# Altium footprint library ICPOWER.PcbLib: 71 footprints (part 2 of 5)
Each footprint in its own frame and in the unit in brackets; x right, y up, seen from the top. Pads: shape width x height; smd on the part's side, far side on the other; paste and mask are expansions set on the pad; w line width, h text height; cw(c..) or ccw(c..) is an arc to the next point about the centre after c.
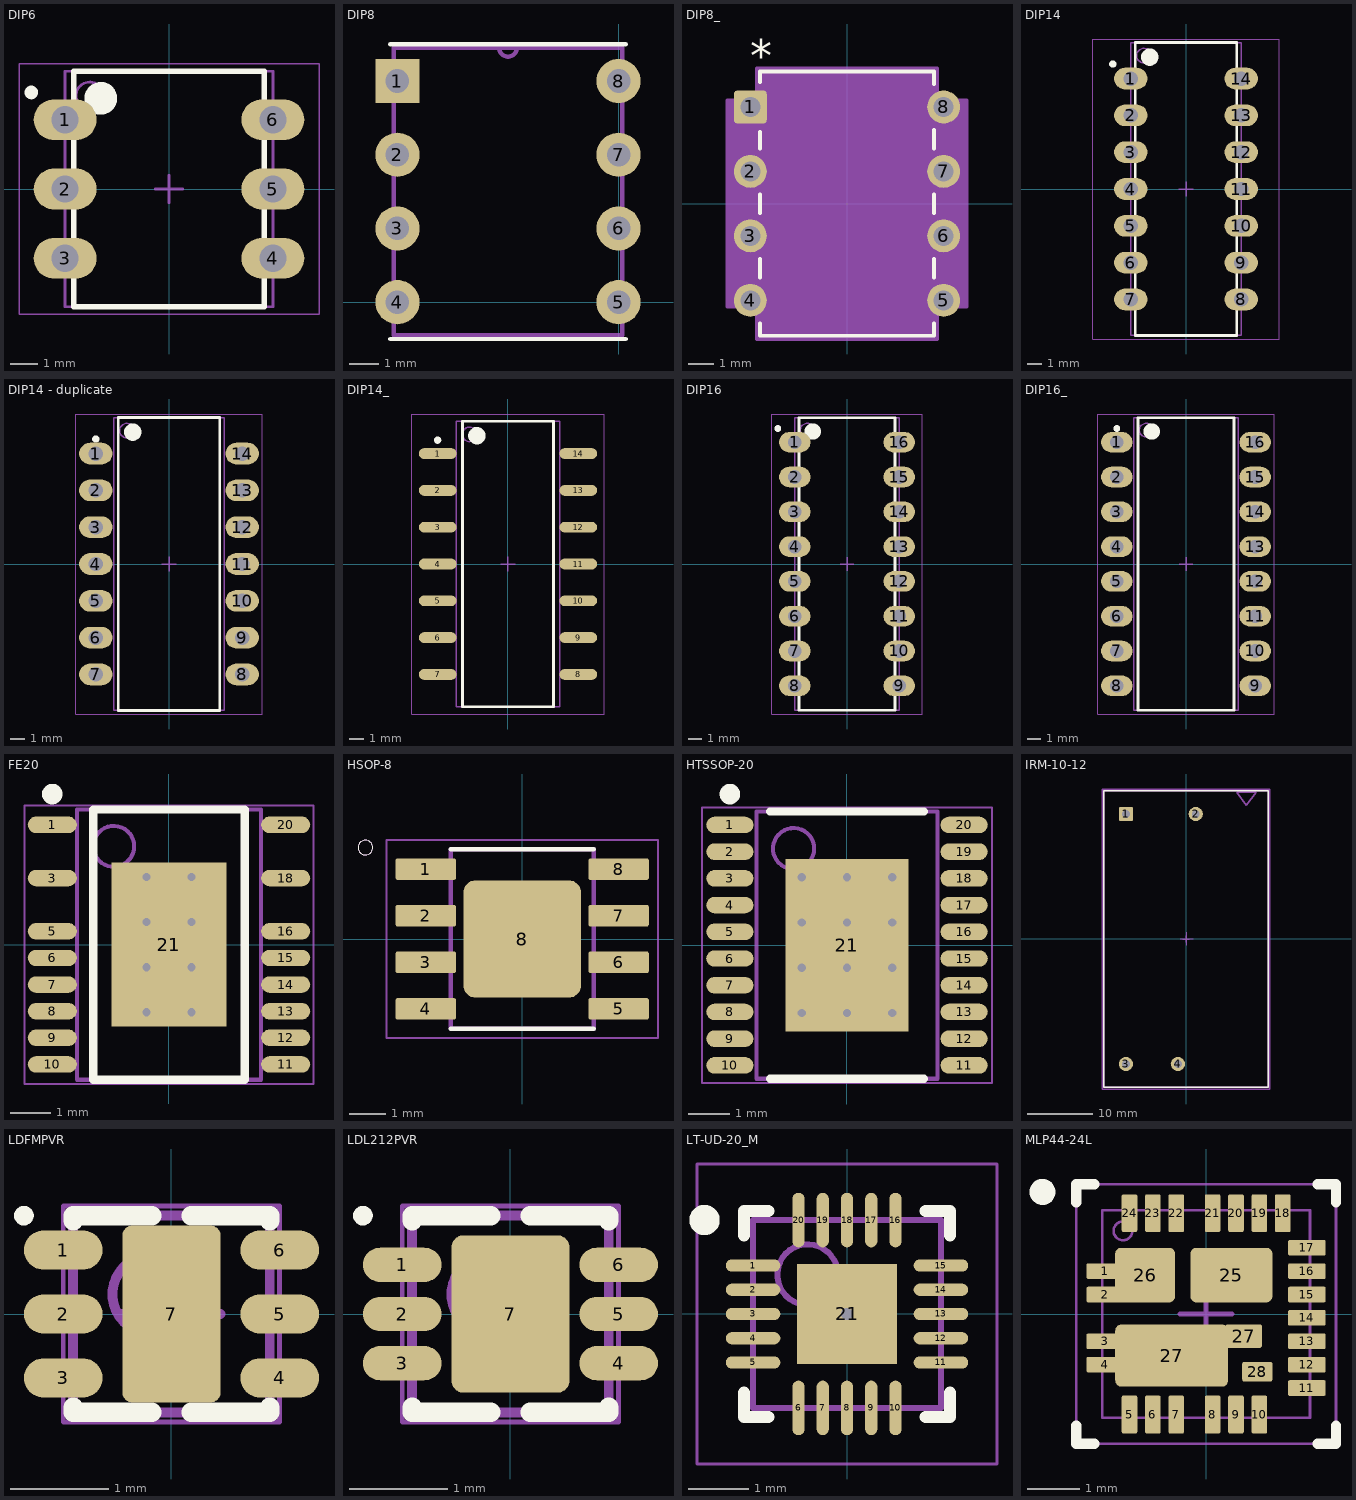
[diagram p1: the footprints below, top view; thin cyan lines are the x and y axes]

## DIP6 [mm] "UC3823N, IPC Medium Density"
height 5.08
pads (6):
  oval 2.3x1.5 hole 1: 1(-3.81,2.54) 2(-3.81,0) 3(-3.81,-2.54) 4(3.81,-2.54) 5(3.81,0) 6(3.81,2.54)
Top Overlay:
  circle w0.25: c-5.05,3.54 r0.125
  circle w0.6: c-2.5,3.325 r0.3
  lines w0.2: -3.5,-4.325 -3.5,4.325 3.5,4.325 3.5,-4.325 -3.5,-4.325
Mechanical 13:
  circle w0.1: c-2.91,3.42 r0.5
  lines w0.1: -3.81,-4.32 3.81,-4.32 3.81,4.32 -3.81,4.32 -3.81,-4.3
Mechanical 15:
  lines w0.05: -5.5,-4.6 -5.5,4.6 5.5,4.6 5.5,-4.6 -5.5,-4.6
  lines w0.1: -0.5,0 0.5,0 ; 0,-0.5 0,0.5
3D body "DIP6.STEP": height 4.8, standoff -2.5, extent -3.925,-3.56 3.945,3.56

## DIP8 [mil]
pads (8):
  rect 60x60 hole 32: 1(-300,300)
  round 60 hole 32: 2(-300,200) 3(-300,100) 4(-300,0) 5(0,0) 6(0,100) 7(0,200) 8(0,300)
Top Overlay:
  lines w6: -310,-50 10,-50 ; -310,350 10,350
M1_3D_TOP:
  lines w6: -162,345 ccw(c-150,345) -138,345 ; -162,345 -305,345 -305,-45 5,-45 5,345 -138,345 ; -162,345 -138,345 ; -316,-16 -305,-16 -305,16 -316,16 -316,-16 ; -316,84 -305,84 -305,116 -316,116 -316,84 ; -316,184 -305,184 -305,216 -316,216 -316,184 ; -316,284 -305,284 -305,316 -316,316 -316,284 ; 5,-16 16,-16 16,16 5,16 5,-16 ; 5,84 16,84 16,116 5,116 5,84 ; 5,184 16,184 16,216 5,216 5,184 ; 5,284 16,284 16,316 5,316 5,284
3D body "DIP8.step": height 165, standoff -105, extent -304.61,-74.8 5.39,375.2

## DIP8_ [mil]
pads (8):
  rrect20% 51x51 hole 31 paste+0 mask+0: 1(-150,150)
  round 51 hole 31 paste+0 mask+0: 2(-150,50) 3(-150,-50) 4(-150,-150) 5(150,-150) 6(150,-50) 7(150,50) 8(150,150)
Top Overlay:
  lines w6: -135,-185.57 -135,-205 135,-205 135,-185.57 ; -135,-114.43 -135,-85.57 ; -135,-14.43 -135,14.43 ; -135,85.57 -135,111.4 ; -135,188.6 -135,205 135,205 135,185.57 ; 135,-114.43 135,-85.57 ; 135,-14.43 135,14.43 ; 135,85.57 135,114.43
  text "*" at -150,205.5 h50
Mechanical 13:
  lines w0: -12,200 ccw(c0,200) 12,200
  lines w1: -165.5,-165.5 -165.5,-134.5 -130,-134.5 -130,-165.5 -165.5,-165.5 ; -165.5,-65.5 -165.5,-34.5 -130,-34.5 -130,-65.5 -165.5,-65.5 ; -165.5,34.5 -165.5,65.5 -130,65.5 -130,34.5 -165.5,34.5 ; -165.5,134.5 -165.5,165.5 -130,165.5 -130,134.5 -165.5,134.5 ; -130,-200 130,-200 130,200 -130,200 -130,-200 ; 130,-165.5 130,-134.5 165.5,-134.5 165.5,-165.5 130,-165.5 ; 130,-65.5 130,-34.5 165.5,-34.5 165.5,-65.5 130,-65.5 ; 130,34.5 130,65.5 165.5,65.5 165.5,34.5 130,34.5 ; 130,134.5 130,165.5 165.5,165.5 165.5,134.5 130,134.5
  text "RefDes2" at 0,0 h50
  text "*" at -120,150 h50
Mechanical 15:
  region: 140,-160 185.5,-160 185.5,160 140,160 140,210 -140,210 -140,160 -185.5,160 -185.5,-160 -140,-160 -140,-210 140,-210
  lines w6: -185.5,-160 -185.5,160 -140,160 -140,210 140,210 140,160 185.5,160 185.5,-160 140,-160 140,-210 -140,-210 -140,-160 -185.5,-160
3D body: height 10, standoff 0, extent 150,-150 160,-140
3D body "DIP8.step": height 165, standoff -105, extent -154.61,-224.8 155.39,225.2

## DIP14 [mm] "DIP14, IPC Medium Density"
height 5.33
pads (14):
  oval 2.3x1.5 hole 1: 1(-3.81,7.62) 2(-3.81,5.08) 3(-3.81,2.54) 4(-3.81,0) 5(-3.81,-2.54) 6(-3.81,-5.08) 7(-3.81,-7.62) 8(3.81,-7.62) 9(3.81,-5.08) 10(3.81,-2.54) 11(3.81,0) 12(3.81,2.54) 13(3.81,5.08) 14(3.81,7.62)
Top Overlay:
  circle w0.6: c-2.5,9.1 r0.3
  circle w0.25: c-5.05,8.62 r0.125
  lines w0.2: -3.5,-10.1 -3.5,10.1 3.5,10.1 3.5,-10.1 -3.5,-10.1
Mechanical 13:
  circle w0.1: c-2.91,9.2 r0.5
  lines w0.1: -3.81,-10.1 -3.81,10.1 3.81,10.1 3.81,-10.1 -3.81,-10.1
Mechanical 15:
  lines w0.05: -6.45,-10.35 -6.45,10.35 6.45,10.35 6.45,-10.35 -6.45,-10.35
  lines w0.1: -0.5,0 0.5,0 ; 0,-0.5 0,0.5
3D body "DIP-14.step": height 4.01, standoff -2.97, extent -4,-9.525 4,9.525

## DIP14 - duplicate [mm] "DIP14, IPC Medium Density"
height 5.33
pads (14):
  oval 2.3x1.5 hole 1: 1(-5.05,7.62) 2(-5.05,5.08) 3(-5.05,2.54) 4(-5.05,0) 5(-5.05,-2.54) 6(-5.05,-5.08) 7(-5.05,-7.62) 8(5.05,-7.62) 9(5.05,-5.08) 10(5.05,-2.54) 11(5.05,0) 12(5.05,2.54) 13(5.05,5.08) 14(5.05,7.62)
Top Overlay:
  circle w0.25: c-5.05,8.62 r0.125
  circle w0.6: c-2.5,9.1 r0.3
  lines w0.2: -3.5,-10.1 3.5,-10.1 3.5,10.1 -3.5,10.1 -3.5,-10.1
Mechanical 13:
  circle w0.1: c-2.91,9.2 r0.5
  lines w0.1: -3.81,-10.1 3.81,-10.1 3.81,10.1 -3.81,10.1 -3.81,-10.1
Mechanical 15:
  lines w0.05: -6.45,-10.35 6.45,-10.35 6.45,10.35 -6.45,10.35 -6.45,-10.35
  lines w0.1: -0.5,0 0.5,0 ; 0,-0.5 0,0.5
3D body "DIP14.step": height 4.95, standoff 0, extent -5.805,-10.1 5.805,10.1

## DIP14_ [mm] "DIP14_MS-001AA, IPC Low Density"
height 5.33
pads (14):
  oval 2.6x0.75 smd: 1(-4.855,7.62) 2(-4.855,5.08) 3(-4.855,2.54) 4(-4.855,0) 5(-4.855,-2.54) 6(-4.855,-5.08) 7(-4.855,-7.62) 8(4.855,-7.62) 9(4.855,-5.08) 10(4.855,-2.54) 11(4.855,0) 12(4.855,2.54) 13(4.855,5.08) 14(4.855,7.62)
Top Overlay:
  circle w0.6: c-2.15,8.85 r0.3
  circle w0.25: c-4.855,8.545 r0.125
  lines w0.2: -3.15,-9.85 -3.15,9.85 3.15,9.85 3.15,-9.85 -3.15,-9.85
M3_comm_top:
  text ".comment" at -0.9,-0.3 h1
Mechanical 13:
  circle w0.1: c-2.655,8.945 r0.5
  lines w0.1: -3.555,-9.845 -3.555,9.845 3.555,9.845 3.555,-9.845 -3.555,-9.845
Mechanical 15:
  lines w0.05: -6.65,-10.35 -6.65,10.35 6.65,10.35 6.65,-10.35 -6.65,-10.35
  lines w0.1: -0.5,0 0.5,0 ; 0,-0.5 0,0.5
3D body: height 5.33, standoff 0.38, extent -3.555,-9.845 3.555,9.845

## DIP16 [mm] "UC3823N, IPC Medium Density"
height 5.08
pads (16):
  oval 2.3x1.5 hole 1: 1(-3.81,8.89) 2(-3.81,6.35) 3(-3.81,3.81) 4(-3.81,1.27) 5(-3.81,-1.27) 6(-3.81,-3.81) 7(-3.81,-6.35) 8(-3.81,-8.89) 9(3.81,-8.89) 10(3.81,-6.35) 11(3.81,-3.81) 12(3.81,-1.27) 13(3.81,1.27) 14(3.81,3.81) 15(3.81,6.35) 16(3.81,8.89)
Top Overlay:
  circle w0.6: c-2.5,9.675 r0.3
  circle w0.25: c-5.05,9.89 r0.125
  lines w0.2: -3.5,-10.675 -3.5,10.675 3.5,10.675 3.5,-10.675 -3.5,-10.675
Mechanical 13:
  circle w0.1: c-2.91,9.77 r0.5
  lines w0.1: -3.81,-10.67 -3.81,10.67 3.81,10.67 3.81,-10.67 -3.81,-10.67
Mechanical 15:
  lines w0.05: -5.5,-10.95 -5.5,10.95 5.5,10.95 5.5,-10.95 -5.5,-10.95
  lines w0.1: -0.5,0 0.5,0 ; 0,-0.5 0,0.5
3D body "DIP16-22mm.STEP": height 5.15, standoff -2.49, extent -3.925,-10.99 3.945,11.01

## DIP16_ [mm] "UC3823N, IPC Medium Density"
height 5.08
pads (16):
  oval 2.3x1.5 hole 1: 1(-5.05,8.89) 2(-5.05,6.35) 3(-5.05,3.81) 4(-5.05,1.27) 5(-5.05,-1.27) 6(-5.05,-3.81) 7(-5.05,-6.35) 8(-5.05,-8.89) 9(5.05,-8.89) 10(5.05,-6.35) 11(5.05,-3.81) 12(5.05,-1.27) 13(5.05,1.27) 14(5.05,3.81) 15(5.05,6.35) 16(5.05,8.89)
Top Overlay:
  circle w0.6: c-2.5,9.675 r0.3
  circle w0.25: c-5.05,9.89 r0.125
  lines w0.2: -3.5,-10.675 -3.5,10.675 3.5,10.675 3.5,-10.675 -3.5,-10.675
Mechanical 13:
  circle w0.1: c-2.91,9.77 r0.5
  lines w0.1: -3.81,-10.67 -3.81,10.67 3.81,10.67 3.81,-10.67 -3.81,-10.67
Mechanical 15:
  lines w0.05: -6.45,-10.95 -6.45,10.95 6.45,10.95 6.45,-10.95 -6.45,-10.95
  lines w0.1: -0.5,0 0.5,0 ; 0,-0.5 0,0.5
3D body "DIP16-22mm.STEP": height 5.15, standoff -2.49, extent -3.925,-10.99 3.945,11.01

## FE20 [mm] "TSSOP20, IPC High Density"
height 1.2
pads (17):
  oval 1.2x0.4 smd: 1(-2.85,2.925) 3(-2.85,1.625) 5(-2.85,0.325) 6(-2.85,-0.325) 7(-2.85,-0.975) 8(-2.85,-1.625) 9(-2.85,-2.275) 10(-2.85,-2.925) 11(2.85,-2.925) 12(2.85,-2.275) 13(2.85,-1.625) 14(2.85,-0.975) 15(2.85,-0.325) 16(2.85,0.325) 18(2.85,1.625) 20(2.85,2.925)
  rect 2.8x4 smd: 21(0,0)
via 0.55,-1.65 diameter 0.5 hole 0.2
via -0.55,-1.65 diameter 0.5 hole 0.2
via 0.55,-0.55 diameter 0.5 hole 0.2
via -0.55,-0.55 diameter 0.5 hole 0.2
via 0.55,0.55 diameter 0.5 hole 0.2
via -0.55,0.55 diameter 0.5 hole 0.2
via 0.55,1.65 diameter 0.5 hole 0.2
via -0.55,1.65 diameter 0.5 hole 0.2
Top Overlay:
  circle w0.25: c-2.85,3.675 r0.125
  lines w0.2: -1.85,-3.3 1.85,-3.3 1.85,3.3 -1.85,3.3 -1.85,-3.3
Mechanical 13:
  circle w0.1: c-1.35,2.4 r0.5
  lines w0.1: -2.25,-3.3 2.25,-3.3 2.25,3.3 -2.25,3.3 -2.25,-3.3
Mechanical 15:
  lines w0.05: -3.525,-3.4 3.525,-3.4 3.525,3.4 -3.525,3.4 -3.525,-3.4
  lines w0.1: -0.5,0 0.5,0 ; 0,-0.5 0,0.5
3D body "FE20.stp": height 1.2, standoff 0, extent -3.2,-3.25 3.2,3.25

## HSOP-8 [mm]
pads (9):
  rrect20% 1.65x0.59 smd: 1(-2.63,1.905) 2(-2.63,0.635) 3(-2.63,-0.635) 4(-2.63,-1.905) 5(2.63,-1.905) 6(2.63,-0.635) 7(2.63,0.635) 8(2.63,1.905)
  rrect20% 3.21x3.2 smd: 8(0,0)
Top Overlay:
  circle w0: c-4.28,2.495 r0.2
  lines w0.127: -1.95,-2.45 1.95,-2.45 ; -1.95,2.45 1.95,2.45
Top Paste:
  region: -0.923,0.8 0.802,0.8 0.802,-0.921 -0.923,-0.921
M1_3D_TOP:
  circle w0: c-4.28,2.495 r0.2
  lines w0.05: -3.705,-2.7 3.705,-2.7 3.705,2.7 -3.705,2.7 -3.705,-2.7
  lines w0.127: -1.95,-2.45 1.95,-2.45 1.95,2.45 -1.95,2.45 -1.95,-2.45
3D body "HSOP8.STEP": height 1.75, standoff 0, extent -3.1,-2.5 3.1,2.5

## HTSSOP-20 [mm] "TSOP, IPC High Density"
height 1.1
pads (21):
  oval 1.15x0.4 smd mask+0.05: 1(-2.85,2.925) 2(-2.85,2.275) 3(-2.85,1.625) 4(-2.85,0.975) 5(-2.85,0.325) 6(-2.85,-0.325) 7(-2.85,-0.975) 8(-2.85,-1.625) 9(-2.85,-2.275) 10(-2.85,-2.925) 11(2.85,-2.925) 12(2.85,-2.275) 13(2.85,-1.625) 14(2.85,-0.975) 15(2.85,-0.325) 16(2.85,0.325) 17(2.85,0.975) 18(2.85,1.625) 19(2.85,2.275) 20(2.85,2.925)
  rect 3x4.2 smd mask+0.05: 21(0,0)
via -1.1,1.65 diameter 0.5 hole 0.2
via 0,1.65 diameter 0.5 hole 0.2
via 1.1,1.65 diameter 0.5 hole 0.2
via -1.1,0.55 diameter 0.5 hole 0.2
via 0,0.55 diameter 0.5 hole 0.2
via 1.1,0.55 diameter 0.5 hole 0.2
via -1.1,-0.55 diameter 0.5 hole 0.2
via 0,-0.55 diameter 0.5 hole 0.2
via 1.1,-0.55 diameter 0.5 hole 0.2
via -1.1,-1.65 diameter 0.5 hole 0.2
via 0,-1.65 diameter 0.5 hole 0.2
via 1.1,-1.65 diameter 0.5 hole 0.2
Top Overlay:
  circle w0.25: c-2.85,3.675 r0.125
  lines w0.2: -1.875,-3.25 1.875,-3.25 ; -1.875,3.25 1.875,3.25
Mechanical 13:
  circle w0.1: c-1.3,2.35 r0.5
  lines w0.1: -2.2,-3.25 -2.2,3.25 2.2,3.25 2.2,-3.25 -2.2,-3.25
Mechanical 15:
  lines w0.05: -3.525,-3.35 -3.525,3.35 3.525,3.35 3.525,-3.35 -3.525,-3.35
  lines w0.1: -0.5,0 0.5,0 ; 0,-0.5 0,0.5
3D body "User Library-HTSSOP20.step": height 0.96, standoff -0.05, extent -3.2,-3.25 3.214,3.25

## IRM-10-12 [mm] "IRM-10-12"
pads (4):
  rrect20% 2.2x2.2 hole 1.2: 1(-9.25,19.25)
  round 2.2 hole 1.2: 2(1.5,19.25) 3(-9.25,-19.25) 4(-1.25,-19.25)
Top Overlay:
  lines w0.2: -12.7,-22.85 12.7,-22.85 12.7,22.85 -12.7,22.85 -12.7,-22.85
M3_comm_top:
  text ".comment" at -2.8,-2.85 h2
M5_asm_top:
  lines w0.2: -12.7,-22.85 -12.7,22.85 12.7,22.85 12.7,-22.85 -12.7,-22.85 ; 7.8,22.6 9.3,20.6 10.8,22.6 7.8,22.6
  text ".Designator" at -3.3,21.3 h2
M7_courtyard_top:
  lines w0.2: -0.5,0 0.5,0 ; 0,-0.5 0,0.5 ; -12.9,-23.1 12.9,-23.1 12.9,23.1 -12.9,23.1 -12.9,-23.1
Mechanical 15:
  lines w0.1: -0.87,0.03 1.13,0.03 ; 0.13,-0.97 0.13,1.03
3D body: height 21.5, standoff 0.05, extent 16.8,-23.6 16.8,-23.6
3D body "IRM-10-12.STEP": height 21.5, standoff -3.5, extent -12.664,-22.814 12.664,22.814

## LDFMPVR [mm] "PQFN, 6-Leads, Body 2,00x2,00mm, Pitch 0,50mm, Thermal Pad 1,45x0,90mm, IPC High Density"
height 0.75
pads (7):
  oval 0.8x0.4 smd: 1(-1.1,0.65) 2(-1.1,0) 3(-1.1,-0.65) 4(1.1,-0.65) 5(1.1,0) 6(1.1,0.65)
  rrect20% 1x1.8 smd: 7(0,0)
Top Overlay:
  circle w0.1: c-1.5,1 r0.05
  lines w0.2: -1,-0.95 -1,-1 -0.2,-1 ; -1,0.95 -1,1 -0.2,1 ; 0.2,-1 1,-1 1,-0.95 ; 0.2,1 1,1 1,0.95
Mechanical 13:
  circle w0.1: c-0.2,0.2 r0.4
  lines w0.1: -1,-1 1,-1 1,1 -1,1 -1,-1
Mechanical 15:
  lines w0.05: -1.1,-1.1 1.1,-1.1 1.1,1.1 -1.1,1.1 -1.1,-1.1
  lines w0.1: -0.5,0 0.5,0 ; 0,-0.5 0,0.5
3D body: height 0.75, standoff 0.1, extent -1,-1 1,1

## LDL212PVR [mm] "PQFN, 6-Leads, Body 2,00x2,00mm, Pitch 0,50mm, Thermal Pad 1,45x0,90mm, IPC High Density"
height 0.75
pads (7):
  oval 0.8x0.35 smd: 1(-1.1,0.5) 2(-1.1,0) 3(-1.1,-0.5) 4(1.1,-0.5) 5(1.1,0) 6(1.1,0.5)
  rrect20% 1.2x1.6 smd: 7(0,0)
Top Overlay:
  circle w0.1: c-1.5,1 r0.05
  lines w0.2: -1,-0.95 -1,-1 -0.2,-1 ; -1,0.95 -1,1 -0.2,1 ; 0.2,-1 1,-1 1,-0.95 ; 0.2,1 1,1 1,0.95
Mechanical 13:
  circle w0.1: c-0.2,0.2 r0.4
  lines w0.1: -1,-1 1,-1 1,1 -1,1 -1,-1
Mechanical 15:
  lines w0.05: -1.1,-1.1 1.1,-1.1 1.1,1.1 -1.1,1.1 -1.1,-1.1
  lines w0.1: -0.5,0 0.5,0 ; 0,-0.5 0,0.5
3D body: height 0.75, standoff 0.1, extent -1,-1 1,1

## LT-UD-20_M [mm] "QFN, 20-Leads, Body 3.1x3.1mm, Pitch 0.4mm, Thermal Pad 1.65x1.65mm, IPC Low Density"
height 0.8
pads (21):
  oval 0.9x0.2 smd: 1(-1.55,0.8) 2(-1.55,0.4) 3(-1.55,0) 4(-1.55,-0.4) 5(-1.55,-0.8) 11(1.55,-0.8) 12(1.55,-0.4) 13(1.55,0) 14(1.55,0.4) 15(1.55,0.8)
  oval 0.2x0.9 smd: 6(-0.8,-1.55) 7(-0.4,-1.55) 8(0,-1.55) 9(0.4,-1.55) 10(0.8,-1.55) 16(0.8,1.55) 17(0.4,1.55) 18(0,1.55) 19(-0.4,1.55) 20(-0.8,1.55)
  rect 1.65x1.65 smd: 21(0,0)
via 0,0 diameter 0.5 hole 0.2
Top Overlay:
  circle w0.25: c-2.35,1.55 r0.125
  lines w0.2: -1.7,-1.3 -1.7,-1.7 -1.3,-1.7 ; -1.7,1.3 -1.7,1.7 -1.3,1.7 ; 1.3,-1.7 1.7,-1.7 1.7,-1.3 ; 1.3,1.7 1.7,1.7 1.7,1.3
Mechanical 13:
  circle w0.1: c-0.65,0.65 r0.5
  lines w0.1: -1.55,-1.55 -1.55,1.55 1.55,1.55 1.55,-1.55 -1.55,-1.55
Mechanical 15:
  lines w0.05: -2.475,-2.475 -2.475,2.475 2.475,2.475 2.475,-2.475 -2.475,-2.475
  lines w0.1: -0.5,0 0.5,0 ; 0,-0.5 0,0.5
3D body: height 0.8, standoff 0, extent -1.55,-1.55 1.55,1.55

## MLP44-24L [mm] "SiC431"
height 0.8
pads (29):
  rrect20% 0.725x0.3 smd: 1(-1.94,0.825) 2(-1.94,0.375) 3(-1.94,-0.525) 4(-1.94,-0.975) 11(1.94,-1.425) 12(1.94,-0.975) 13(1.94,-0.525) 14(1.94,-0.075) 15(1.94,0.375) 16(1.94,0.825) 17(1.94,1.275)
  rrect20% 0.3x0.73 smd: 5(-1.475,-1.935) 6(-1.025,-1.935) 7(-0.575,-1.935) 8(0.125,-1.935) 9(0.575,-1.935) 10(1.025,-1.935)
  rrect20% 0.3x0.725 smd: 18(1.475,1.94) 19(1.025,1.94) 20(0.575,1.94) 21(0.125,1.94) 22(-0.575,1.94) 23(-1.025,1.94) 24(-1.475,1.94)
  rrect20% 1.575x1.05 smd: 25(0.487,0.75)
  rrect20% 1.15x1.05 smd: 26(-1.175,0.75)
  rrect20% 2.175x1.2 smd: 27(-0.663,-0.8)
  rrect20% 0.7x0.455 smd: 27(0.725,-0.425)
  rrect20% 0.58x0.38 smd: 28(0.985,-1.11)
Top Overlay:
  circle w0.25: c-3.15,2.35 r0.125
  lines w0.2: -2.5,-2.15 -2.5,-2.5 -2.15,-2.5 ; -2.5,2.15 -2.5,2.5 -2.15,2.5 ; 2.15,-2.5 2.5,-2.5 2.5,-2.15 ; 2.15,2.5 2.5,2.5 2.5,2.15
Mechanical 13:
  circle w0.05: c-1.6,1.6 r0.18
  lines w0.05: -2,-2 2,-2 2,2 -2,2 -2,-2
Mechanical 15:
  lines w0.05: -2.5,-2.5 2.5,-2.5 2.5,2.5 -2.5,2.5 -2.5,-2.5
  lines w0.1: -0.5,0 0.5,0 ; 0,-0.5 0,0.5
3D body: height 0.8, standoff 0, extent -2,-2 2,2